# Altium footprint library NDLib.PCBLIB: 499 footprints (part 2 of 32)
Each footprint in its own frame and in the unit in brackets; x right, y up, seen from the top. Pads: shape width x height; smd on the part's side, far side on the other; paste and mask are expansions set on the pad; w line width, h text height; cw(c..) or ccw(c..) is an arc to the next point about the centre after c.
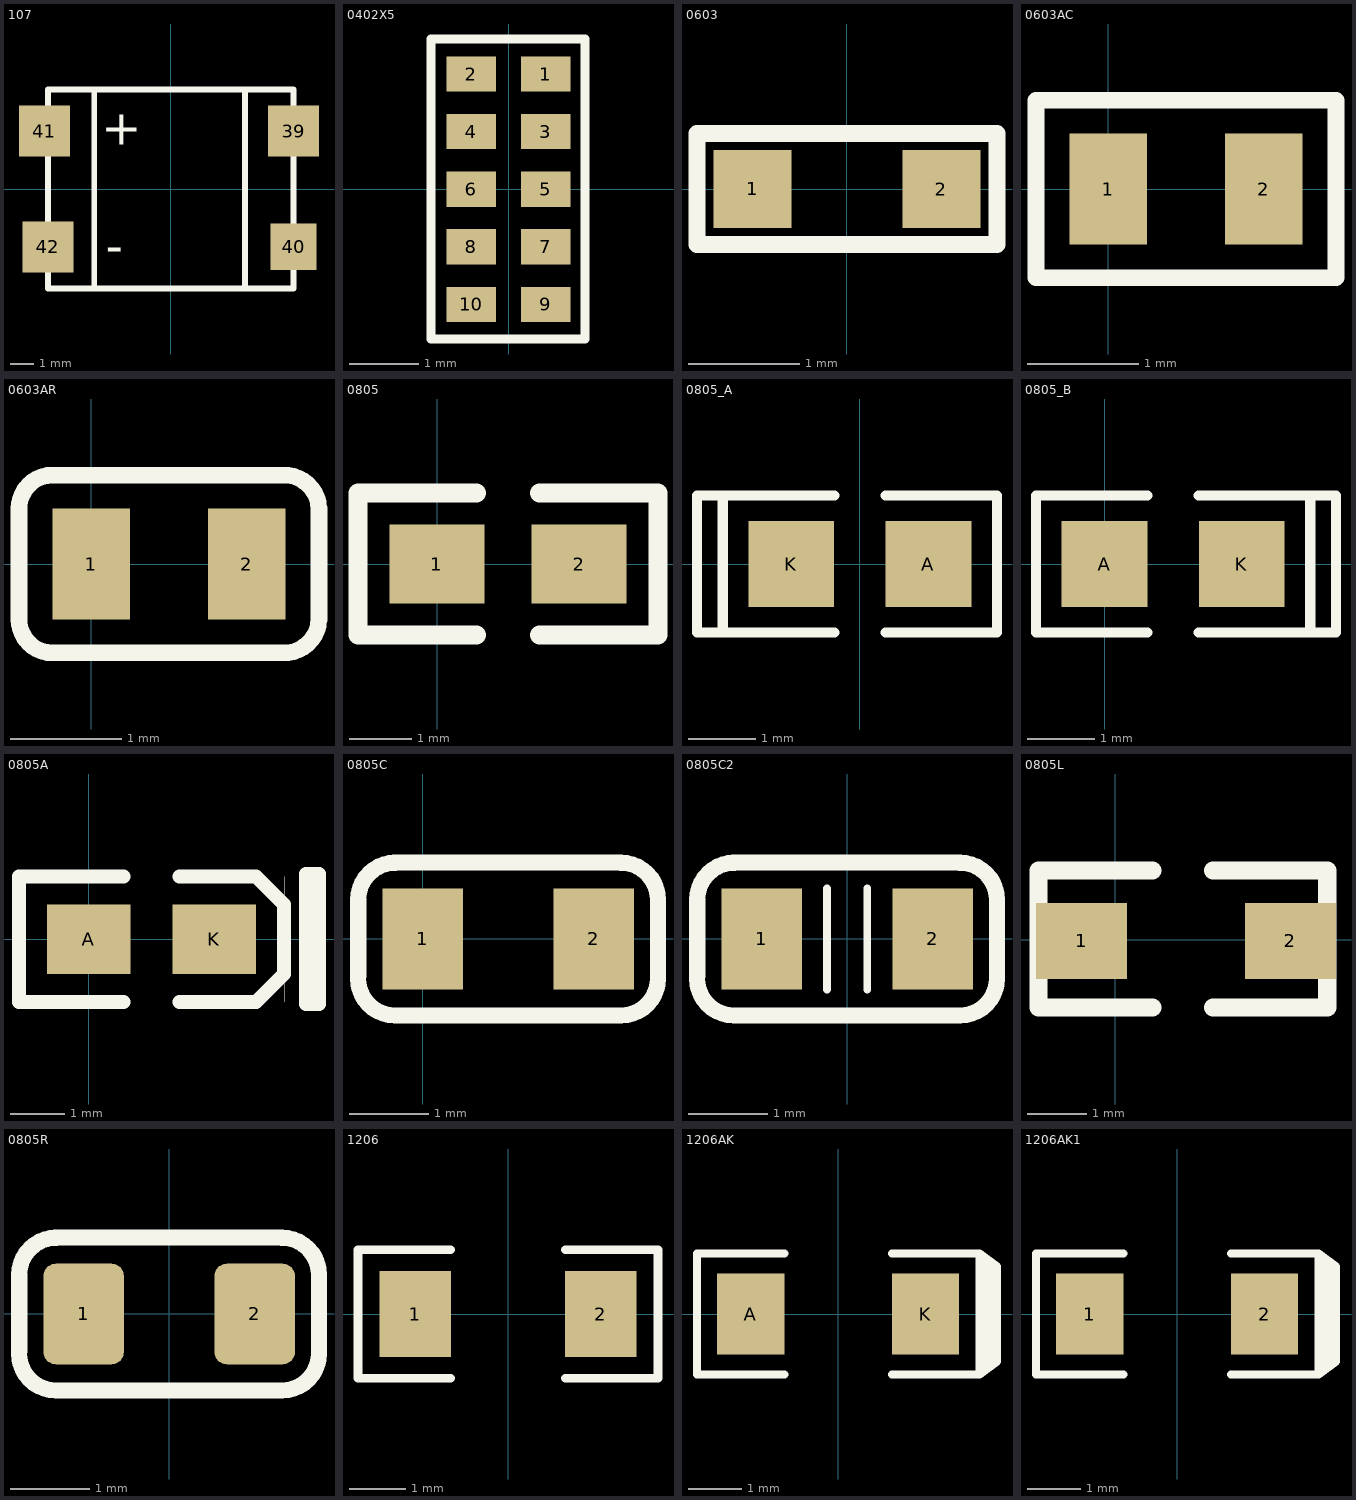
[diagram p1: the footprints below, top view; thin cyan lines are the x and y axes]

## 107 [mm]
pads (4):
  rect 2.2x2.2 all layers, no hole: 39(5.308,2.503) 41(-5.442,2.503) 42(-5.292,-2.497)
  rect 2x2 all layers, no hole: 40(5.308,-2.497)
TopOverlay:
  lines w0.254: -3.292,-4.197 -3.292,4.303 ; 3.208,-4.297 3.208,4.303 ; -5.292,-4.297 5.308,-4.297 5.308,4.303 -5.292,4.303 -5.292,-4.297
  text "+" at -2.992,1.903 h1.52
  text "-" at -2.792,-3.197 h1.52

## 0402X5 [mil]
pads (10):
  rect 28x20 smd: 1(21.13,65.46) 2(-21.13,65.46) 3(21.13,32.73) 4(-21.13,32.73) 5(21.13,0) 6(-21.13,0) 7(21.13,-32.73) 8(-21.13,-32.73) 9(21.13,-65.46) 10(-21.13,-65.46)
TopOverlay:
  lines w5: -44.06,-85.14 -44.06,85.39 43.43,85.39 43.43,-85.14 -44.06,-85.14

## 0603 [mm]
pads (2):
  rect 0.7x0.7 smd: 1(-0.85,0) 2(0.85,0)
TopOverlay:
  lines w0.15: -1.35,-0.5 -1.35,0.5 1.35,0.5 1.35,-0.5 -1.35,-0.5

## 0603AC [mm]
pads (2):
  rect 0.7x1 smd: 1(0,0) 2(1.4,0)
TopOverlay:
  lines w0.15: -0.65,-0.8 -0.65,0.8 2.05,0.8 2.05,-0.8 -0.65,-0.8
3D body: height 0.3, standoff 0, extent -0.089,-0.381 1.511,0.419

## 0603AR [mm]
pads (2):
  rect 0.7x1 smd: 1(0,0) 2(1.4,0)
TopOverlay:
  lines w0.15: 2.05,0.475 2.05,-0.5 cw(c1.737,-0.487) 1.725,-0.8 -0.35,-0.8 cw(c-0.35,-0.5) -0.65,-0.5 -0.65,0.5 cw(c-0.35,0.5) -0.35,0.8 1.725,0.8 cw(c1.737,0.487) 2.05,0.5
3D body: height 0.3, standoff 0, extent -0.1,-0.4 1.5,0.4

## 0805 [mil]
pads (2):
  rect 60x50 smd: 1(-0.2,0.31) 2(89.8,0.31)
TopOverlay:
  lines w12: 24.8,-44.69 -50.2,-44.69 -50.2,45.31 24.8,45.31 ; 64.8,-44.69 139.8,-44.69 139.8,45.31 64.8,45.31

## 0805_A [mil]
pads (2):
  rect 50x50 smd: A(40,0) K(-40,0)
TopOverlay:
  lines w6: -80,-40 -80,40 ; -15,-40 -95,-40 -95,40 -15,40 ; 15,-40 80,-40 80,40 15,40

## 0805_B [mil]
pads (2):
  rect 50x50 smd: A(0,0) K(80,0)
TopOverlay:
  lines w6: 25,-40 -40,-40 -40,40 25,40 ; 55,-40 135,-40 135,40 55,40 ; 120,-40 120,40

## 0805A [mil]
pads (2):
  rect 60x50 smd: A(0,0) K(90,0)
TopOverlay:
  rectangle: 140,-45 140,45
  lines w10: 25,-45 -50,-45 -50,45 25,45 ; 65,-45 120,-45 140,-25 140,25 120,45 65,45 ; 155.86,-46.28 155.86,46.72 165.05,46.72 165.05,-46.28 155.86,-46.28

## 0805C [mil]
height 39.37
pads (2):
  rect 40x50 smd: 1(0,0) 2(85,0)
TopOverlay:
  lines w8: -32.11,-19.59 ccw(c-13.7,-19.59) -13.7,-38 ; -32,-18.5 -32,18.5 ; -32,19.5 cw(c-13.59,19.5) -13.59,37.91 ; -14.12,38 98.09,38 ; -12.7,-38 98.11,-38 ; 98.59,-38 ccw(c98.59,-19.59) 117,-19.59 ; 98.59,37.91 cw(c98.59,19.5) 117,19.5 ; 117,-18.59 117,18.5
3D body: height 30.39, standoff -0.39, extent 3.15,-24.61 81.89,24.61

## 0805C2 [mil]
height 39.37
pads (2):
  rect 40x50 smd: 1(-42.5,0) 2(42.5,0)
TopOverlay:
  lines w3.94: -10,-25 -10,25 ; 10,-25 10,25
  lines w8: -74.61,-19.59 ccw(c-56.2,-19.59) -56.2,-38 ; -74.5,-18.5 -74.5,18.5 ; -74.5,19.5 cw(c-56.09,19.5) -56.09,37.91 ; -56.62,38 55.59,38 ; -55.2,-38 55.61,-38 ; 56.09,-38 ccw(c56.09,-19.59) 74.5,-19.59 ; 56.09,37.91 cw(c56.09,19.5) 74.5,19.5 ; 74.5,-18.59 74.5,18.5
3D body: height 30.39, standoff -0.39, extent -39.35,-24.61 39.39,24.61

## 0805L [mil]
pads (2):
  rect 60x50 smd: 1(-22.07,-0.93) 2(115.39,-0.93)
TopOverlay:
  lines w12: 24.65,-44.63 -50.35,-44.63 -50.35,45.37 24.65,45.37 ; 64.65,-44.63 139.65,-44.63 139.65,45.37 64.65,45.37

## 0805R [mil]
height 39.37
pads (2):
  rrect30% 40x50 smd: 1(-42.5,0) 2(42.5,0)
TopOverlay:
  lines w8: -74.61,-19.59 ccw(c-56.2,-19.59) -56.2,-38 ; -74.5,-18.5 -74.5,18.5 ; -74.5,19.5 cw(c-56.09,19.5) -56.09,37.91 ; -56.62,38 55.59,38 ; -55.2,-38 55.61,-38 ; 56.09,-38 ccw(c56.09,-19.59) 74.5,-19.59 ; 56.09,37.91 cw(c56.09,19.5) 74.5,19.5 ; 74.5,-18.59 74.5,18.5
3D body: height 30.39, standoff -0.39, extent -39.24,-24.61 39.5,24.61

## 1206 [mil]
pads (2):
  rect 50x60 smd: 1(-65,0) 2(65,0)
TopOverlay:
  lines w6: -40,-45 -105,-45 -105,45 -40,45 ; 40,-45 105,-45 105,45 40,45

## 1206AK [mil]
pads (2):
  rect 50x60 smd: A(-65,0) K(65,0)
TopOverlay:
  region: 105,45 108.54,45 118.11,35.43 118.11,-35.43 108.54,-45 105,-45
  lines w6: -40,-45 -105,-45 -105,45 -40,45 ; 40,-45 105,-45 ; 40,45 105,45 ; 105,-45 105,45 ; 105,-45 118.11,-35.43 118.11,35.43 105,45

## 1206AK1 [mil]
pads (2):
  rect 50x60 smd: 1(-65,0) 2(65,0)
TopOverlay:
  region: 105,45 108.54,45 118.11,35.43 118.11,-35.43 108.54,-45 105,-45
  lines w6: -40,-45 -105,-45 -105,45 -40,45 ; 40,-45 105,-45 ; 40,45 105,45 ; 105,-45 118.11,-35.43 118.11,35.43 105,45 ; 105,-45 105,45